# Altium footprint library HARTING THD.PcbLib: 113 footprints (part 7 of 11) (continued)
## HARTING_09 66 152 6612 [mm] "Right Angled D-Sub 9 Female Contacts With Grounding Board Locks And UNC 4-40 Flange" (continued)
  text "1" at -8.439,-2.107 h1.5
  text "6" at -8.566,0.433 h1.5
  text "9" at 7.656,0.508 h1.5
  text "5" at 7.656,-2.032 h1.5
3D body "HARTING_09 66 152 6612.stp": height 13.6, standoff -3.2, extent -15.6,-3.33 15.6,17.87

## HARTING_09 66 252 6612 [mm] "Right Angled D-Sub 15 Female Contacts With Grounding Board Locks And UNC 4-40 Flange Thread"
height 13.6
pads (17):
  round 1.7 hole 1: 1(-9.59,-1.27) 2(-6.85,-1.27) 3(-4.11,-1.27) 4(-1.37,-1.27) 5(1.37,-1.27) 6(4.11,-1.27) 7(6.85,-1.27) 8(9.59,-1.27) 9(-8.22,1.27) 10(-5.48,1.27) 11(-2.74,1.27) 12(0,1.27) 13(2.74,1.27) 14(5.48,1.27) 15(8.22,1.27)
  round 5.5 hole 3.2: 16(-16.65,0) 17(16.65,0)
Top Overlay:
  circle w0.5: c-9.585,-4.355 r0.25
  lines w0.2: -19.75,7.17 19.75,7.17 ; -13.3,7.17 -13.3,5.57 13.3,5.57 13.3,7.17 ; -12.75,5.57 -12.75,2.67 12.75,2.67 12.75,5.57 ; -12.33,11.67 -12.33,17.37 cw(c-11.834,17.374) -11.838,17.87 11.838,17.87 cw(c11.834,17.374) 12.331,17.37 12.331,11.67 ; -19.75,-3.33 19.75,-3.33 19.75,11.67 -19.75,11.67 -19.75,-3.33
  text "9" at -11.175,0.77 h1.2
  text "1" at -11.638,-1.9 h1.2
  text "15" at 10.372,0.77 h1.2
  text "8" at 11.125,-1.83 h1.2
Mechanical 8:
  lines w0.1: -17.15,0 -16.65,0 ; -16.65,-0.5 -16.65,0 ; -16.65,0.5 -16.65,0 ; -16.15,0 -16.65,0 ; -10.09,-1.27 -9.59,-1.27 ; -9.59,-1.77 -9.59,-1.27 ; -9.59,-0.77 -9.59,-1.27 ; -9.09,-1.27 -9.59,-1.27 ; -8.72,1.27 -8.22,1.27 ; -8.22,0.77 -8.22,1.27 ; -8.22,1.77 -8.22,1.27 ; -7.72,1.27 -8.22,1.27 ; -7.35,-1.27 -6.85,-1.27 ; -6.85,-1.77 -6.85,-1.27 ; -6.85,-0.77 -6.85,-1.27 ; -6.35,-1.27 -6.85,-1.27 ; -5.98,1.27 -5.48,1.27 ; -5.48,0.77 -5.48,1.27 ; -5.48,1.77 -5.48,1.27 ; -4.98,1.27 -5.48,1.27 ; -4.61,-1.27 -4.11,-1.27 ; -4.11,-1.77 -4.11,-1.27 ; -4.11,-0.77 -4.11,-1.27 ; -3.61,-1.27 -4.11,-1.27 ; -3.24,1.27 -2.74,1.27 ; -2.74,0.77 -2.74,1.27 ; -2.74,1.77 -2.74,1.27 ; -2.24,1.27 -2.74,1.27 ; -1.87,-1.27 -1.37,-1.27 ; -1.37,-1.77 -1.37,-1.27 ; -1.37,-0.77 -1.37,-1.27 ; -0.87,-1.27 -1.37,-1.27 ; -0.5,0 0,0 ; -0.5,1.27 0,1.27 ; 0,-0.5 0,0 ; 0,0.5 0,0 ; 0,0.77 0,1.27 ; 0,1.77 0,1.27 ; 0.5,0 0,0 ; 0.5,1.27 0,1.27 ; 0.87,-1.27 1.37,-1.27 ; 1.37,-1.77 1.37,-1.27 ; 1.37,-0.77 1.37,-1.27 ; 1.87,-1.27 1.37,-1.27 ; 2.24,1.27 2.74,1.27 ; 2.74,0.77 2.74,1.27 ; 2.74,1.77 2.74,1.27 ; 3.24,1.27 2.74,1.27 ; 3.61,-1.27 4.11,-1.27 ; 4.11,-1.77 4.11,-1.27 ; 4.11,-0.77 4.11,-1.27 ; 4.61,-1.27 4.11,-1.27 ; 4.98,1.27 5.48,1.27 ; 5.48,0.77 5.48,1.27 ; 5.48,1.77 5.48,1.27 ; 5.98,1.27 5.48,1.27 ; 6.35,-1.27 6.85,-1.27 ; 6.85,-1.77 6.85,-1.27 ; 6.85,-0.77 6.85,-1.27 ; 7.35,-1.27 6.85,-1.27 ; 7.72,1.27 8.22,1.27 ; 8.22,0.77 8.22,1.27 ; 8.22,1.77 8.22,1.27 ; 8.72,1.27 8.22,1.27 ; 9.09,-1.27 9.59,-1.27 ; 9.59,-1.77 9.59,-1.27 ; 9.59,-0.77 9.59,-1.27 ; 10.09,-1.27 9.59,-1.27 ; 16.15,0 16.65,0 ; 16.65,-0.5 16.65,0 ; 16.65,0.5 16.65,0 ; 17.15,0 16.65,0
Mechanical 14:
  lines w0.1: -19.75,7.17 19.75,7.17 ; -13.3,7.17 -13.3,5.57 13.3,5.57 13.3,7.17 ; -12.75,5.57 -12.75,2.67 -9.89,2.67 ; -12.33,11.67 -12.33,17.37 cw(c-11.834,17.374) -11.838,17.87 11.838,17.87 cw(c11.834,17.374) 12.331,17.37 12.331,11.67 ; -9.89,5.57 -9.89,-1.27 ccw(c-9.59,-1.27) -9.29,-1.27 -9.29,5.57 ; -9.29,2.67 -8.52,2.67 ; -8.52,5.57 -8.52,1.27 ccw(c-8.22,1.27) -7.92,1.27 -7.92,5.57 ; -7.92,2.67 -7.15,2.67 ; -7.15,5.57 -7.15,-1.27 ccw(c-6.85,-1.27) -6.55,-1.27 -6.55,5.57 ; -6.55,2.67 -5.78,2.67 ; -5.78,5.57 -5.78,1.27 ccw(c-5.48,1.27) -5.18,1.27 -5.18,5.57 ; -5.18,2.67 -4.41,2.67 ; -4.41,5.57 -4.41,-1.27 ccw(c-4.11,-1.27) -3.81,-1.27 -3.81,5.57 ; -3.81,2.67 -3.04,2.67 ; -3.04,5.57 -3.04,1.27 ccw(c-2.74,1.27) -2.44,1.27 -2.44,5.57 ; -2.44,2.67 -1.67,2.67 ; -1.67,5.57 -1.67,-1.27 ccw(c-1.37,-1.27) -1.07,-1.27 -1.07,5.57 ; -1.07,2.67 -0.3,2.67 ; -0.3,5.57 -0.3,1.27 ccw(c0,1.27) 0.3,1.27 0.3,5.57 ; 0.3,2.67 1.07,2.67 ; 1.07,5.57 1.07,-1.27 ccw(c1.37,-1.27) 1.67,-1.27 1.67,5.57 ; 1.67,2.67 2.44,2.67 ; 2.44,5.57 2.44,1.27 ccw(c2.74,1.27) 3.04,1.27 3.04,5.57 ; 3.04,2.67 3.81,2.67 ; 3.81,5.57 3.81,-1.27 ccw(c4.11,-1.27) 4.41,-1.27 4.41,5.57 ; 4.41,2.67 5.18,2.67 ; 5.18,5.57 5.18,1.27 ccw(c5.48,1.27) 5.78,1.27 5.78,5.57 ; 5.78,2.67 6.55,2.67 ; 6.55,5.57 6.55,-1.27 ccw(c6.85,-1.27) 7.15,-1.27 7.15,5.57 ; 7.15,2.67 7.92,2.67 ; 7.92,5.57 7.92,1.27 ccw(c8.22,1.27) 8.52,1.27 8.52,5.57 ; 8.52,2.67 9.29,2.67 ; 9.29,5.57 9.29,-1.27 ccw(c9.59,-1.27) 9.89,-1.27 9.89,5.57 ; 9.89,2.67 12.75,2.67 12.75,5.57 ; -19.75,-3.33 19.75,-3.33 19.75,11.67 -19.75,11.67 -19.75,-3.33
  text "9" at -11.175,0.77 h1.2
  text "1" at -11.638,-1.9 h1.2
  text "15" at 10.372,0.77 h1.2
  text "8" at 11.125,-1.83 h1.2
3D body "HARTING_09 66 252 6612.stp": height 13.6, standoff -3.2, extent -19.75,-3.33 19.75,17.87

## HARTING_09 66 252 7611 [mm] "Right Angled D-Sub 15 Female Contacts With Grounding Board Locks And M3 Flange Thread"
height 13.6
pads (17):
  round 1.7 hole 1: 1(-9.59,-1.27) 2(-6.85,-1.27) 3(-4.11,-1.27) 4(-1.37,-1.27) 5(1.37,-1.27) 6(4.11,-1.27) 7(6.85,-1.27) 8(9.59,-1.27) 9(-8.22,1.27) 10(-5.48,1.27) 11(-2.74,1.27) 12(0,1.27) 13(2.74,1.27) 14(5.48,1.27) 15(8.22,1.27)
  round 5.5 hole 3.2: 16(-16.65,0) 17(16.65,0)
Top Overlay:
  circle w0.5: c-9.585,-4.355 r0.25
  lines w0.2: -19.75,7.17 19.75,7.17 ; -13.3,7.17 -13.3,5.57 13.3,5.57 13.3,7.17 ; -12.75,5.57 -12.75,2.67 12.75,2.67 12.75,5.57 ; -12.33,11.67 -12.33,17.37 cw(c-11.834,17.374) -11.838,17.87 11.838,17.87 cw(c11.834,17.374) 12.331,17.37 12.331,11.67 ; -19.75,-3.33 -19.75,11.67 19.75,11.67 19.75,-3.33 -19.75,-3.33
  text "8" at 11.125,-1.83 h1.2
  text "15" at 10.372,0.77 h1.2
  text "1" at -11.638,-1.9 h1.2
  text "9" at -11.175,0.77 h1.2
Mechanical 8:
  lines w0.1: -17.15,0 -16.65,0 ; -16.65,-0.5 -16.65,0 ; -16.65,0.5 -16.65,0 ; -16.15,0 -16.65,0 ; -10.09,-1.27 -9.59,-1.27 ; -9.59,-1.77 -9.59,-1.27 ; -9.59,-0.77 -9.59,-1.27 ; -9.09,-1.27 -9.59,-1.27 ; -8.72,1.27 -8.22,1.27 ; -8.22,0.77 -8.22,1.27 ; -8.22,1.77 -8.22,1.27 ; -7.72,1.27 -8.22,1.27 ; -7.35,-1.27 -6.85,-1.27 ; -6.85,-1.77 -6.85,-1.27 ; -6.85,-0.77 -6.85,-1.27 ; -6.35,-1.27 -6.85,-1.27 ; -5.98,1.27 -5.48,1.27 ; -5.48,0.77 -5.48,1.27 ; -5.48,1.77 -5.48,1.27 ; -4.98,1.27 -5.48,1.27 ; -4.61,-1.27 -4.11,-1.27 ; -4.11,-1.77 -4.11,-1.27 ; -4.11,-0.77 -4.11,-1.27 ; -3.61,-1.27 -4.11,-1.27 ; -3.24,1.27 -2.74,1.27 ; -2.74,0.77 -2.74,1.27 ; -2.74,1.77 -2.74,1.27 ; -2.24,1.27 -2.74,1.27 ; -1.87,-1.27 -1.37,-1.27 ; -1.37,-1.77 -1.37,-1.27 ; -1.37,-0.77 -1.37,-1.27 ; -0.87,-1.27 -1.37,-1.27 ; -0.5,0 0,0 ; -0.5,1.27 0,1.27 ; 0,-0.5 0,0 ; 0,0.5 0,0 ; 0,0.77 0,1.27 ; 0,1.77 0,1.27 ; 0.5,0 0,0 ; 0.5,1.27 0,1.27 ; 0.87,-1.27 1.37,-1.27 ; 1.37,-1.77 1.37,-1.27 ; 1.37,-0.77 1.37,-1.27 ; 1.87,-1.27 1.37,-1.27 ; 2.24,1.27 2.74,1.27 ; 2.74,0.77 2.74,1.27 ; 2.74,1.77 2.74,1.27 ; 3.24,1.27 2.74,1.27 ; 3.61,-1.27 4.11,-1.27 ; 4.11,-1.77 4.11,-1.27 ; 4.11,-0.77 4.11,-1.27 ; 4.61,-1.27 4.11,-1.27 ; 4.98,1.27 5.48,1.27 ; 5.48,0.77 5.48,1.27 ; 5.48,1.77 5.48,1.27 ; 5.98,1.27 5.48,1.27 ; 6.35,-1.27 6.85,-1.27 ; 6.85,-1.77 6.85,-1.27 ; 6.85,-0.77 6.85,-1.27 ; 7.35,-1.27 6.85,-1.27 ; 7.72,1.27 8.22,1.27 ; 8.22,0.77 8.22,1.27 ; 8.22,1.77 8.22,1.27 ; 8.72,1.27 8.22,1.27 ; 9.09,-1.27 9.59,-1.27 ; 9.59,-1.77 9.59,-1.27 ; 9.59,-0.77 9.59,-1.27 ; 10.09,-1.27 9.59,-1.27 ; 16.15,0 16.65,0 ; 16.65,-0.5 16.65,0 ; 16.65,0.5 16.65,0 ; 17.15,0 16.65,0
Mechanical 14:
  lines w0.1: -19.75,7.17 19.75,7.17 ; -13.3,7.17 -13.3,5.57 13.3,5.57 13.3,7.17 ; -12.75,5.57 -12.75,2.67 -9.89,2.67 ; -12.33,11.67 -12.33,17.37 cw(c-11.834,17.374) -11.838,17.87 11.838,17.87 cw(c11.834,17.374) 12.331,17.37 12.331,11.67 ; -9.89,5.57 -9.89,-1.27 ccw(c-9.59,-1.27) -9.29,-1.27 -9.29,5.57 ; -9.29,2.67 -8.52,2.67 ; -8.52,5.57 -8.52,1.27 ccw(c-8.22,1.27) -7.92,1.27 -7.92,5.57 ; -7.92,2.67 -7.15,2.67 ; -7.15,5.57 -7.15,-1.27 ccw(c-6.85,-1.27) -6.55,-1.27 -6.55,5.57 ; -6.55,2.67 -5.78,2.67 ; -5.78,5.57 -5.78,1.27 ccw(c-5.48,1.27) -5.18,1.27 -5.18,5.57 ; -5.18,2.67 -4.41,2.67 ; -4.41,5.57 -4.41,-1.27 ccw(c-4.11,-1.27) -3.81,-1.27 -3.81,5.57 ; -3.81,2.67 -3.04,2.67 ; -3.04,5.57 -3.04,1.27 ccw(c-2.74,1.27) -2.44,1.27 -2.44,5.57 ; -2.44,2.67 -1.67,2.67 ; -1.67,5.57 -1.67,-1.27 ccw(c-1.37,-1.27) -1.07,-1.27 -1.07,5.57 ; -1.07,2.67 -0.3,2.67 ; -0.3,5.57 -0.3,1.27 ccw(c0,1.27) 0.3,1.27 0.3,5.57 ; 0.3,2.67 1.07,2.67 ; 1.07,5.57 1.07,-1.27 ccw(c1.37,-1.27) 1.67,-1.27 1.67,5.57 ; 1.67,2.67 2.44,2.67 ; 2.44,5.57 2.44,1.27 ccw(c2.74,1.27) 3.04,1.27 3.04,5.57 ; 3.04,2.67 3.81,2.67 ; 3.81,5.57 3.81,-1.27 ccw(c4.11,-1.27) 4.41,-1.27 4.41,5.57 ; 4.41,2.67 5.18,2.67 ; 5.18,5.57 5.18,1.27 ccw(c5.48,1.27) 5.78,1.27 5.78,5.57 ; 5.78,2.67 6.55,2.67 ; 6.55,5.57 6.55,-1.27 ccw(c6.85,-1.27) 7.15,-1.27 7.15,5.57 ; 7.15,2.67 7.92,2.67 ; 7.92,5.57 7.92,1.27 ccw(c8.22,1.27) 8.52,1.27 8.52,5.57 ; 8.52,2.67 9.29,2.67 ; 9.29,5.57 9.29,-1.27 ccw(c9.59,-1.27) 9.89,-1.27 9.89,5.57 ; 9.89,2.67 12.75,2.67 12.75,5.57 ; -19.75,-3.33 -19.75,11.67 19.75,11.67 19.75,-3.33 -19.75,-3.33
  text "8" at 11.125,-1.83 h1.2
  text "15" at 10.372,0.77 h1.2
  text "1" at -11.638,-1.9 h1.2
  text "9" at -11.175,0.77 h1.2
3D body "HARTING_09 66 252 7611.stp": height 13.6, standoff -3.2, extent -19.75,-3.33 19.75,17.87

## HARTING_09 66 351 6512 [mm] "Straight D-Sub 25 Female Contacts with 4-40 UNC Flange Thread"
height 12.3
pads (27):
  round 1.5 hole 1: 1(16.56,1.42) 2(13.8,1.42) 3(11.04,1.42) 4(8.28,1.42) 5(5.52,1.42) 6(2.76,1.42) 7(0,1.42) 8(-2.76,1.42) 9(-5.52,1.42) 10(-8.28,1.42) 11(-11.04,1.42) 12(-13.8,1.42) 13(-16.56,1.42) 14(15.18,-1.42) 15(12.42,-1.42) 16(9.66,-1.42) 17(6.9,-1.42) 18(4.14,-1.42) 19(1.38,-1.42) 20(-1.38,-1.42) 21(-4.14,-1.42) 22(-6.9,-1.42) 23(-9.66,-1.42) 24(-12.42,-1.42) 25(-15.18,-1.42)
  round 5.5 hole 3.2: 26(23.52,0) 27(-23.52,0)
Top Overlay:
  circle w0.5: c16.56,7.42 r0.25
  lines w0.2: -26.6,-4.75 ccw(c-25.1,-4.75) -25.1,-6.25 25.1,-6.25 ccw(c25.1,-4.75) 26.6,-4.75 26.6,4.75 ccw(c25.1,4.75) 25.1,6.25 -25.1,6.25 ccw(c-25.1,4.75) -26.6,4.75 -26.6,-4.75 ; -19.883,0.977 cw(c-16.83,1.515) -16.83,4.615 16.83,4.615 cw(c16.83,1.515) 19.883,0.977 19.349,-2.053 cw(c16.296,-1.515) 16.296,-4.615 -16.296,-4.615 cw(c-16.296,-1.515) -19.349,-2.053 -19.883,0.977
  text "14" at 19.825,-5.275 h1.5
  text "13" at -22.025,3.925 h1.5
  text "25" at -21.9,-5.2 h1.5
  text "1" at 20.675,3.85 h1.5
Mechanical 8:
  lines w0.1: -24.52,0 -23.52,0 ; -23.52,-1 -23.52,0 ; -23.52,1 -23.52,0 ; -22.52,0 -23.52,0 ; -17.56,1.42 -16.56,1.42 ; -16.56,0.42 -16.56,1.42 ; -16.56,2.42 -16.56,1.42 ; -16.18,-1.42 -15.18,-1.42 ; -15.56,1.42 -16.56,1.42 ; -15.18,-2.42 -15.18,-1.42 ; -15.18,-0.42 -15.18,-1.42 ; -14.8,1.42 -13.8,1.42 ; -14.18,-1.42 -15.18,-1.42 ; -13.8,0.42 -13.8,1.42 ; -13.8,2.42 -13.8,1.42 ; -13.42,-1.42 -12.42,-1.42 ; -12.8,1.42 -13.8,1.42 ; -12.42,-2.42 -12.42,-1.42 ; -12.42,-0.42 -12.42,-1.42 ; -12.04,1.42 -11.04,1.42 ; -11.42,-1.42 -12.42,-1.42 ; -11.04,0.42 -11.04,1.42 ; -11.04,2.42 -11.04,1.42 ; -10.66,-1.42 -9.66,-1.42 ; -10.04,1.42 -11.04,1.42 ; -9.66,-2.42 -9.66,-1.42 ; -9.66,-0.42 -9.66,-1.42 ; -9.28,1.42 -8.28,1.42 ; -8.66,-1.42 -9.66,-1.42 ; -8.28,0.42 -8.28,1.42 ; -8.28,2.42 -8.28,1.42 ; -7.9,-1.42 -6.9,-1.42 ; -7.28,1.42 -8.28,1.42 ; -6.9,-2.42 -6.9,-1.42 ; -6.9,-0.42 -6.9,-1.42 ; -6.52,1.42 -5.52,1.42 ; -5.9,-1.42 -6.9,-1.42 ; -5.52,0.42 -5.52,1.42 ; -5.52,2.42 -5.52,1.42 ; -5.14,-1.42 -4.14,-1.42 ; -4.52,1.42 -5.52,1.42 ; -4.14,-2.42 -4.14,-1.42 ; -4.14,-0.42 -4.14,-1.42 ; -3.76,1.42 -2.76,1.42 ; -3.14,-1.42 -4.14,-1.42 ; -2.76,0.42 -2.76,1.42 ; -2.76,2.42 -2.76,1.42 ; -2.38,-1.42 -1.38,-1.42 ; -1.76,1.42 -2.76,1.42 ; -1.38,-2.42 -1.38,-1.42 ; -1.38,-0.42 -1.38,-1.42 ; -1,0 0,0 ; -1,1.42 0,1.42 ; -0.38,-1.42 -1.38,-1.42 ; 0,-1 0,0 ; 0,0.42 0,1.42 ; 0,1 0,0 ; 0,2.42 0,1.42 ; 0.38,-1.42 1.38,-1.42 ; 1,0 0,0 ; 1,1.42 0,1.42 ; 1.38,-2.42 1.38,-1.42 ; 1.38,-0.42 1.38,-1.42 ; 1.76,1.42 2.76,1.42 ; 2.38,-1.42 1.38,-1.42 ; 2.76,0.42 2.76,1.42 ; 2.76,2.42 2.76,1.42 ; 3.14,-1.42 4.14,-1.42 ; 3.76,1.42 2.76,1.42 ; 4.14,-2.42 4.14,-1.42 ; 4.14,-0.42 4.14,-1.42 ; 4.52,1.42 5.52,1.42 ; 5.14,-1.42 4.14,-1.42 ; 5.52,0.42 5.52,1.42 ; 5.52,2.42 5.52,1.42 ; 5.9,-1.42 6.9,-1.42 ; 6.52,1.42 5.52,1.42 ; 6.9,-2.42 6.9,-1.42 ; 6.9,-0.42 6.9,-1.42 ; 7.28,1.42 8.28,1.42 ; 7.9,-1.42 6.9,-1.42 ; 8.28,0.42 8.28,1.42 ; 8.28,2.42 8.28,1.42 ; 8.66,-1.42 9.66,-1.42 ; 9.28,1.42 8.28,1.42 ; 9.66,-2.42 9.66,-1.42 ; 9.66,-0.42 9.66,-1.42 ; 10.04,1.42 11.04,1.42 ; 10.66,-1.42 9.66,-1.42 ; 11.04,0.42 11.04,1.42 ; 11.04,2.42 11.04,1.42 ; 11.42,-1.42 12.42,-1.42 ; 12.04,1.42 11.04,1.42 ; 12.42,-2.42 12.42,-1.42 ; 12.42,-0.42 12.42,-1.42 ; 12.8,1.42 13.8,1.42 ; 13.42,-1.42 12.42,-1.42 ; 13.8,0.42 13.8,1.42 ; 13.8,2.42 13.8,1.42 ; 14.18,-1.42 15.18,-1.42 ; 14.8,1.42 13.8,1.42 ; 15.18,-2.42 15.18,-1.42 ; 15.18,-0.42 15.18,-1.42 ; 15.56,1.42 16.56,1.42 ; 16.18,-1.42 15.18,-1.42 ; 16.56,0.42 16.56,1.42 ; 16.56,2.42 16.56,1.42 ; 17.56,1.42 16.56,1.42 ; 22.52,0 23.52,0 ; 23.52,-1 23.52,0 ; 23.52,1 23.52,0 ; 24.52,0 23.52,0
Mechanical 14:
  circle w0.1: c-23.52,0 r1.5
  circle w0.1: c23.52,0 r1.5
  lines w0.1: -26.6,-4.75 ccw(c-25.1,-4.75) -25.1,-6.25 25.1,-6.25 ccw(c25.1,-4.75) 26.6,-4.75 26.6,4.75 ccw(c25.1,4.75) 25.1,6.25 -25.1,6.25 ccw(c-25.1,4.75) -26.6,4.75 -26.6,-4.75 ; -19.883,0.977 cw(c-16.83,1.515) -16.83,4.615 16.83,4.615 cw(c16.83,1.515) 19.883,0.977 19.349,-2.053 cw(c16.296,-1.515) 16.296,-4.615 -16.296,-4.615 cw(c-16.296,-1.515) -19.349,-2.053 -19.883,0.977 ; -19.391,1.064 cw(c-16.83,1.515) -16.83,4.115 16.83,4.115 cw(c16.83,1.515) 19.391,1.064 18.856,-1.966 cw(c16.296,-1.515) 16.296,-4.115 -16.296,-4.115 cw(c-16.296,-1.515) -18.856,-1.966 -19.391,1.064
  text "1" at 20.675,3.85 h1.5
  text "25" at -21.9,-5.2 h1.5
  text "13" at -22.025,3.925 h1.5
  text "14" at 19.825,-5.275 h1.5
3D body "HARTING_09 66 351 6512.stp": height 12.33, standoff -4, extent -26.6,-6.25 26.6,6.25

## HARTING_09 66 452 6612 [mm] "Right Angled, D-SUB 37 Female Contacts for PCB  With Grounding Board Lock And Female Screwlock UNC 4-40"
height 12.5
pads (39):
  round 1.5 hole 1: 1(-24.84,-12.94) 2(-22.08,-12.94) 3(-19.32,-12.94) 4(-16.56,-12.94) 5(-13.8,-12.94) 6(-11.04,-12.94) 7(-8.28,-12.94) 8(-5.52,-12.94) 9(-2.76,-12.94) 10(0,-12.94) 11(2.76,-12.94) 12(5.52,-12.94) 13(8.28,-12.94) 14(11.04,-12.94) 15(13.8,-12.94) 16(16.56,-12.94) 17(19.32,-12.94) 18(22.08,-12.94) 19(24.84,-12.94) 20(-23.46,-10.4) 21(-20.7,-10.4) 22(-17.94,-10.4) 23(-15.18,-10.4) 24(-12.42,-10.4) 25(-9.66,-10.4) 26(-6.9,-10.4) 27(-4.14,-10.4) 28(-1.38,-10.4) 29(1.38,-10.4) 30(4.14,-10.4) 31(6.9,-10.4) 32(9.66,-10.4) 33(12.42,-10.4) 34(15.18,-10.4) 35(17.94,-10.4) 36(20.7,-10.4) 37(23.46,-10.4)
  round 3.8 hole 3.2: 38(-31.75,-11.67) 39(31.75,-11.67)
Top Overlay:
  circle w0.5: c-24.835,-16.025 r0.25
  lines w0.2: -34.85,-4.5 34.85,-4.5 ; -28.4,-4.5 -28.4,-6.1 28.4,-6.1 28.4,-4.5 ; -27.85,-15 -27.85,-6.1 ; -27.85,-9 27.85,-9 ; -27.436,0 -27.436,6.2 27.436,6.2 27.436,0 ; 27.85,-15 27.85,-6.1 ; -34.85,-15 34.85,-15 ; -34.85,-15 -34.85,0 34.85,0 34.85,-15 ; -34.85,-15 34.85,-15
  text "20" at -26.397,-10.858 h0.97
  text "1" at -26.616,-13.358 h0.97
  text "19" at 26.014,-13.373 h0.97
  text "37" at 24.682,-10.833 h0.97
Mechanical 8:
  lines w0.05: -31.75,-11.7 -30.15,-11.7 ; -24.84,-12.94 24.84,-12.94 ; -23.46,-10.4 23.46,-10.4 ; -3.012,-11.67 0,-11.67 3.012,-11.67 ; 0,-12.94 0,-10.4 ; 31.75,-11.7 33.35,-11.7
Mechanical 14:
  lines w0.1: -34.85,-4.5 34.85,-4.5 ; -28.4,-4.5 -28.4,-6.1 28.4,-6.1 28.4,-4.5 ; -27.85,-15 -27.85,-6.1 ; -27.85,-9 27.85,-9 ; -27.436,0 -27.436,6.2 27.436,6.2 27.436,0 ; 27.85,-15 27.85,-6.1 ; -34.85,-15 34.85,-15 ; -34.85,-15 -34.85,0 34.85,0 34.85,-15 ; -34.85,-15 34.85,-15
  text "20" at -26.397,-10.858 h0.97
  text "1" at -26.616,-13.358 h0.97
  text "19" at 26.014,-13.373 h0.97
  text "37" at 24.682,-10.833 h0.97
3D body "HARTING_09 66 452 6612.stp": height 13.6, standoff -3.2, extent -34.85,-15 34.85,6.2

## HARTING_09 66 552 7611 [mm] "Right Angled D-Sub 50 Female Contacts With Grounding Board Locks And  M3 Nuts Thread"
height 16.4
pads (52):
  round 1.7 hole 1: 1(-22.08,-2.54) 2(-19.32,-2.54) 3(-16.56,-2.54) 4(-13.8,-2.54) 5(-11.04,-2.54) 6(-8.28,-2.54) 7(-5.52,-2.54) 8(-2.76,-2.54) 9(0,-2.54) 10(2.76,-2.54) 11(5.52,-2.54) 12(8.28,-2.54) 13(11.04,-2.54) 14(13.8,-2.54) 15(16.56,-2.54) 16(19.32,-2.54) 17(22.08,-2.54) 18(-20.7,0) 19(-17.94,0) 20(-15.18,0) 21(-12.42,0) 22(-9.66,0) 23(-6.9,0) 24(-4.14,0) 25(-1.38,0) 26(1.38,0) 27(4.14,0) 28(6.9,0) 29(9.66,0) 30(12.42,0) 31(15.18,0) 32(17.94,0) 33(20.7,0) 34(-22.08,2.54) 35(-19.32,2.54) 36(-16.56,2.54) 37(-13.8,2.54) 38(-11.04,2.54) 39(-8.28,2.54) 40(-5.52,2.54) 41(-2.76,2.54) 42(0,2.54) 43(2.76,2.54) 44(5.52,2.54) 45(8.28,2.54) 46(11.04,2.54) 47(13.8,2.54) 48(16.56,2.54) 49(19.32,2.54) 50(22.08,2.54)
  round 3.8 hole 3.1: 51(-30.55,0) 52(30.55,0)
Top Overlay:
  circle w0.5: c-22.075,-5.625 r0.25
  lines w0.2: -33.5,8.44 33.5,8.44 ; -33.5,12.44 33.5,12.44 ; -27.1,8.44 -27.1,6.84 27.1,6.84 27.134,8.44 ; -26.25,12.94 -26.25,18.64 cw(c-25.75,18.64) -25.75,19.14 25.75,19.14 cw(c25.75,18.64) 26.25,18.64 26.25,12.94 ; -23.5,-4.56 -23.5,6.84 ; -23.5,3.94 26.5,3.94 ; 26.5,-4.56 26.5,6.84 ; -33.5,-4.56 33.5,-4.56 33.5,12.94 -33.5,12.94 -33.5,-4.56
  text "50" at 23.656,1.788 h1.2
  text "33" at 23.701,-0.652 h1.2
  text "1" at -25.089,-3.207 h1.2
  text "34" at -26.694,1.993 h1.2
  text "18" at -26.541,-0.517 h1.2
  text "17" at 23.656,-3.292 h1.2
Mechanical 8:
  drawing of 212 lines, arcs and shapes, not listed
Mechanical 14:
  drawing of 165 lines, arcs and shapes, not listed
  text "50" at 23.656,1.788 h1.2
  text "33" at 23.701,-0.652 h1.2
  text "18" at -26.541,-0.517 h1.2
  text "17" at 23.656,-3.292 h1.2
  text "34" at -26.694,1.993 h1.2
  text "1" at -25.089,-3.207 h1.2
3D body "HARTING_09 66 552 7611.stp": height 16.4, standoff -3.2, extent -33.5,-4.56 33.5,19.14

## HARTING_09 66 562 7811 [mm] "Right Angled D-Sub 50 Male Contacts With Grounding Board Locks And  M3 Nuts Thread"
height 16.4
pads (52):
  round 1.7 hole 1: 1(22.08,-2.54) 2(19.32,-2.54) 3(16.56,-2.54) 4(13.8,-2.54) 5(11.04,-2.54) 6(8.28,-2.54) 7(5.52,-2.54) 8(2.76,-2.54) 9(0,-2.54) 10(-2.76,-2.54) 11(-5.52,-2.54) 12(-8.28,-2.54) 13(-11.04,-2.54) 14(-13.8,-2.54) 15(-16.56,-2.54) 16(-19.32,-2.54) 17(-22.08,-2.54) 18(20.7,0) 19(17.94,0) 20(15.18,0) 21(12.42,0) 22(9.66,0) 23(6.9,0) 24(4.14,0) 25(1.38,0) 26(-1.38,0) 27(-4.14,0) 28(-6.9,0) 29(-9.66,0) 30(-12.42,0) 31(-15.18,0) 32(-17.94,0) 33(-20.7,0) 34(22.08,2.54) 35(19.32,2.54) 36(16.56,2.54) 37(13.8,2.54) 38(11.04,2.54) 39(8.28,2.54) 40(5.52,2.54) 41(2.76,2.54) 42(0,2.54) 43(-2.76,2.54) 44(-5.52,2.54) 45(-8.28,2.54) 46(-11.04,2.54) 47(-13.8,2.54) 48(-16.56,2.54) 49(-19.32,2.54) 50(-22.08,2.54)
  round 3.8 hole 3.1: 51(-30.55,0) 52(30.55,0)
Top Overlay:
  circle w0.5: c22.085,-5.625 r0.25
  lines w0.2: -33.5,8.44 33.5,8.44 ; -33.5,12.44 33.466,12.44 ; -32,8.44 -32,12.44 ; -26.858,12.94 -26.858,18.94 26.858,18.94 26.858,12.94 ; -26.5,7.34 26.5,7.34 ; -26.5,8.44 -26.5,-4.56 -33.5,-4.56 -33.5,12.94 33.5,12.94 33.5,-4.56 26.5,-4.56 26.5,8.44 ; 32,8.44 32,12.44
  text "50" at -25.619,1.938 h1.2
  text "33" at -25.574,-0.502 h1.2
  text "1" at 23.986,-3.007 h1.2
  text "34" at 23.731,1.968 h1.2
  text "18" at 23.884,-0.542 h1.2
  text "17" at -25.619,-3.142 h1.2
Mechanical 8:
  drawing of 212 lines, arcs and shapes, not listed
Mechanical 14:
  lines w0.1: -33.5,8.44 33.5,8.44 ; -33.5,12.44 33.466,12.44 ; -32,8.44 -32,12.44 ; -31.528,1.036 -31.115,0.322 -29.809,1.076 -30.221,1.791 -31.502,1.051 ; -26.858,12.94 -26.858,18.94 26.858,18.94 26.858,12.94 ; -26.5,7.34 26.5,7.34 ; -26.5,8.44 -26.5,-4.56 -33.5,-4.56 -33.5,12.94 33.5,12.94 33.5,-4.56 26.5,-4.56 26.5,8.44 ; 32,8.44 32,12.44 ; -31.291,-1.396 -30.879,-2.111 -29.572,-1.356 -30.01,-0.657 -31.291,-1.396 ; 29.572,-1.356 29.985,-0.642 31.291,-1.396 30.879,-2.111 29.572,-1.356 ; 29.809,1.076 30.221,1.791 31.528,1.036 31.115,0.322 29.809,1.076
  text "50" at -25.619,1.938 h1.2
  text "33" at -25.574,-0.502 h1.2
  text "18" at 23.884,-0.542 h1.2
  text "17" at -25.619,-3.142 h1.2
  text "34" at 23.731,1.968 h1.2
  text "1" at 23.986,-3.007 h1.2
3D body "HARTING_09 66 562 7811.stp": height 16.4, standoff -3.2, extent -33.5,-4.56 33.5,18.94

## HARTING_09 67 015 4707 [mm] "D-Sub, Female, 15 Poles, Wrap Posts"
height 12
pads (17):
  round 1.7 hole 1: 1(9.59,1.42) 2(6.85,1.42) 3(4.11,1.42) 4(1.37,1.42) 5(-1.37,1.42) 6(-4.11,1.42) 7(-6.85,1.42) 8(-9.59,1.42) 9(8.22,-1.42) 10(5.48,-1.42) 11(2.74,-1.42) 12(0,-1.42) 13(-2.74,-1.42) 14(-5.48,-1.42) 15(-8.22,-1.42)
  round 5.5 hole 3.2: 16(-16.65,0) 17(16.65,0)
Top Overlay:
  circle w0.5: c9.59,7.42 r0.25
  lines w0.2: -19.75,-4.75 ccw(c-18.25,-4.75) -18.25,-6.25 18.25,-6.25 ccw(c18.25,-4.75) 19.75,-4.75 19.75,4.75 ccw(c18.25,4.75) 18.25,6.25 -18.25,6.25 ccw(c-18.25,4.75) -19.75,4.75 -19.75,-4.75 ; -12.311,0.949 cw(c-9.75,1.4) -9.75,4 9.75,4 cw(c9.75,1.4) 12.311,0.949 11.817,-1.851 cw(c9.256,-1.4) 9.256,-4 -9.256,-4 cw(c-9.256,-1.4) -11.817,-1.851 -12.311,0.949
  text "15" at -14,-4.125 h1.2
  text "8" at -13.625,3.575 h1.2
  text "1" at 12.51,3.748 h1.2
  text "9" at 12.35,-3.875 h1.2
Mechanical 8:
  lines w0.1: -17.15,0 -16.65,0 ; -16.65,-0.5 -16.65,0 ; -16.65,0.5 -16.65,0 ; -16.15,0 -16.65,0 ; -10.09,1.42 -9.59,1.42 ; -9.59,0.92 -9.59,1.42 ; -9.59,1.92 -9.59,1.42 ; -9.09,1.42 -9.59,1.42 ; -8.72,-1.42 -8.22,-1.42 ; -8.22,-1.92 -8.22,-1.42 ; -8.22,-0.92 -8.22,-1.42 ; -7.72,-1.42 -8.22,-1.42 ; -7.35,1.42 -6.85,1.42 ; -6.85,0.92 -6.85,1.42 ; -6.85,1.92 -6.85,1.42 ; -6.35,1.42 -6.85,1.42 ; -5.98,-1.42 -5.48,-1.42 ; -5.48,-1.92 -5.48,-1.42 ; -5.48,-0.92 -5.48,-1.42 ; -4.98,-1.42 -5.48,-1.42 ; -4.61,1.42 -4.11,1.42 ; -4.11,0.92 -4.11,1.42 ; -4.11,1.92 -4.11,1.42 ; -3.61,1.42 -4.11,1.42 ; -3.24,-1.42 -2.74,-1.42 ; -2.74,-1.92 -2.74,-1.42 ; -2.74,-0.92 -2.74,-1.42 ; -2.24,-1.42 -2.74,-1.42 ; -1.87,1.42 -1.37,1.42 ; -1.37,0.92 -1.37,1.42 ; -1.37,1.92 -1.37,1.42 ; -0.87,1.42 -1.37,1.42 ; -0.5,-1.42 0,-1.42 ; -0.5,0 0,0 ; 0,-1.92 0,-1.42 ; 0,-0.92 0,-1.42 ; 0,-0.5 0,0 ; 0,0.5 0,0 ; 0.5,-1.42 0,-1.42 ; 0.5,0 0,0 ; 0.87,1.42 1.37,1.42 ; 1.37,0.92 1.37,1.42 ; 1.37,1.92 1.37,1.42 ; 1.87,1.42 1.37,1.42 ; 2.24,-1.42 2.74,-1.42 ; 2.74,-1.92 2.74,-1.42 ; 2.74,-0.92 2.74,-1.42 ; 3.24,-1.42 2.74,-1.42 ; 3.61,1.42 4.11,1.42 ; 4.11,0.92 4.11,1.42 ; 4.11,1.92 4.11,1.42 ; 4.61,1.42 4.11,1.42 ; 4.98,-1.42 5.48,-1.42 ; 5.48,-1.92 5.48,-1.42 ; 5.48,-0.92 5.48,-1.42 ; 5.98,-1.42 5.48,-1.42 ; 6.35,1.42 6.85,1.42 ; 6.85,0.92 6.85,1.42 ; 6.85,1.92 6.85,1.42 ; 7.35,1.42 6.85,1.42 ; 7.72,-1.42 8.22,-1.42 ; 8.22,-1.92 8.22,-1.42 ; 8.22,-0.92 8.22,-1.42 ; 8.72,-1.42 8.22,-1.42 ; 9.09,1.42 9.59,1.42 ; 9.59,0.92 9.59,1.42 ; 9.59,1.92 9.59,1.42 ; 10.09,1.42 9.59,1.42 ; 16.15,0 16.65,0 ; 16.65,-0.5 16.65,0 ; 16.65,0.5 16.65,0 ; 17.15,0 16.65,0
Mechanical 14:
  circle w0.1: c-8.22,-1.42 r0.55
  circle w0.1: c-5.48,-1.42 r0.55
  circle w0.1: c-2.74,-1.42 r0.55
  circle w0.1: c0,-1.42 r0.55
  circle w0.1: c2.74,-1.42 r0.55
  circle w0.1: c5.48,-1.42 r0.55
  circle w0.1: c8.22,-1.42 r0.55
  circle w0.1: c9.59,1.42 r0.55
  circle w0.1: c6.85,1.42 r0.55
  circle w0.1: c4.11,1.42 r0.55
  circle w0.1: c1.37,1.42 r0.55
  circle w0.1: c-1.37,1.42 r0.55
  circle w0.1: c-4.11,1.42 r0.55
  circle w0.1: c-6.85,1.42 r0.55
  circle w0.1: c-9.59,1.42 r0.55
  circle w0.1: c16.65,0 r1.55
  circle w0.1: c-16.65,0 r1.55
  circle w0.1: c-8.22,-1.42 r0.92
  circle w0.1: c-5.48,-1.42 r0.92
  circle w0.1: c-2.74,-1.42 r0.92
  circle w0.1: c0,-1.42 r0.92
  circle w0.1: c2.74,-1.42 r0.92
  circle w0.1: c5.48,-1.42 r0.92
  circle w0.1: c8.22,-1.42 r0.92
  circle w0.1: c9.59,1.42 r0.92
  circle w0.1: c6.85,1.42 r0.92
  circle w0.1: c4.11,1.42 r0.92
  circle w0.1: c1.37,1.42 r0.92
  circle w0.1: c-1.37,1.42 r0.92
  circle w0.1: c-4.11,1.42 r0.92
  circle w0.1: c-6.85,1.42 r0.92
  circle w0.1: c-9.59,1.42 r0.92
  lines w0.1: -19.75,-4.75 ccw(c-18.25,-4.75) -18.25,-6.25 18.25,-6.25 ccw(c18.25,-4.75) 19.75,-4.75 19.75,4.75 ccw(c18.25,4.75) 18.25,6.25 -18.25,6.25 ccw(c-18.25,4.75) -19.75,4.75 -19.75,-4.75 ; -12.311,0.949 cw(c-9.75,1.4) -9.75,4 9.75,4 cw(c9.75,1.4) 12.311,0.949 11.817,-1.851 cw(c9.256,-1.4) 9.256,-4 -9.256,-4 cw(c-9.256,-1.4) -11.817,-1.851 -12.311,0.949
  text "9" at 12.35,-3.875 h1.2
  text "1" at 12.51,3.748 h1.2
  text "8" at -13.625,3.575 h1.2
  text "15" at -14,-4.125 h1.2
3D body "HARTING_09 67 015 4707.stp": height 12, standoff -13, extent -19.75,-6.25 19.75,6.25